# Altium footprint library 镙丝套件.PcbLib: 33 footprints (part 1 of 3)
Each footprint in its own frame and in the unit in brackets; x right, y up, seen from the top. Pads: shape width x height; smd on the part's side, far side on the other; paste and mask are expansions set on the pad; w line width, h text height; cw(c..) or ccw(c..) is an arc to the next point about the centre after c.
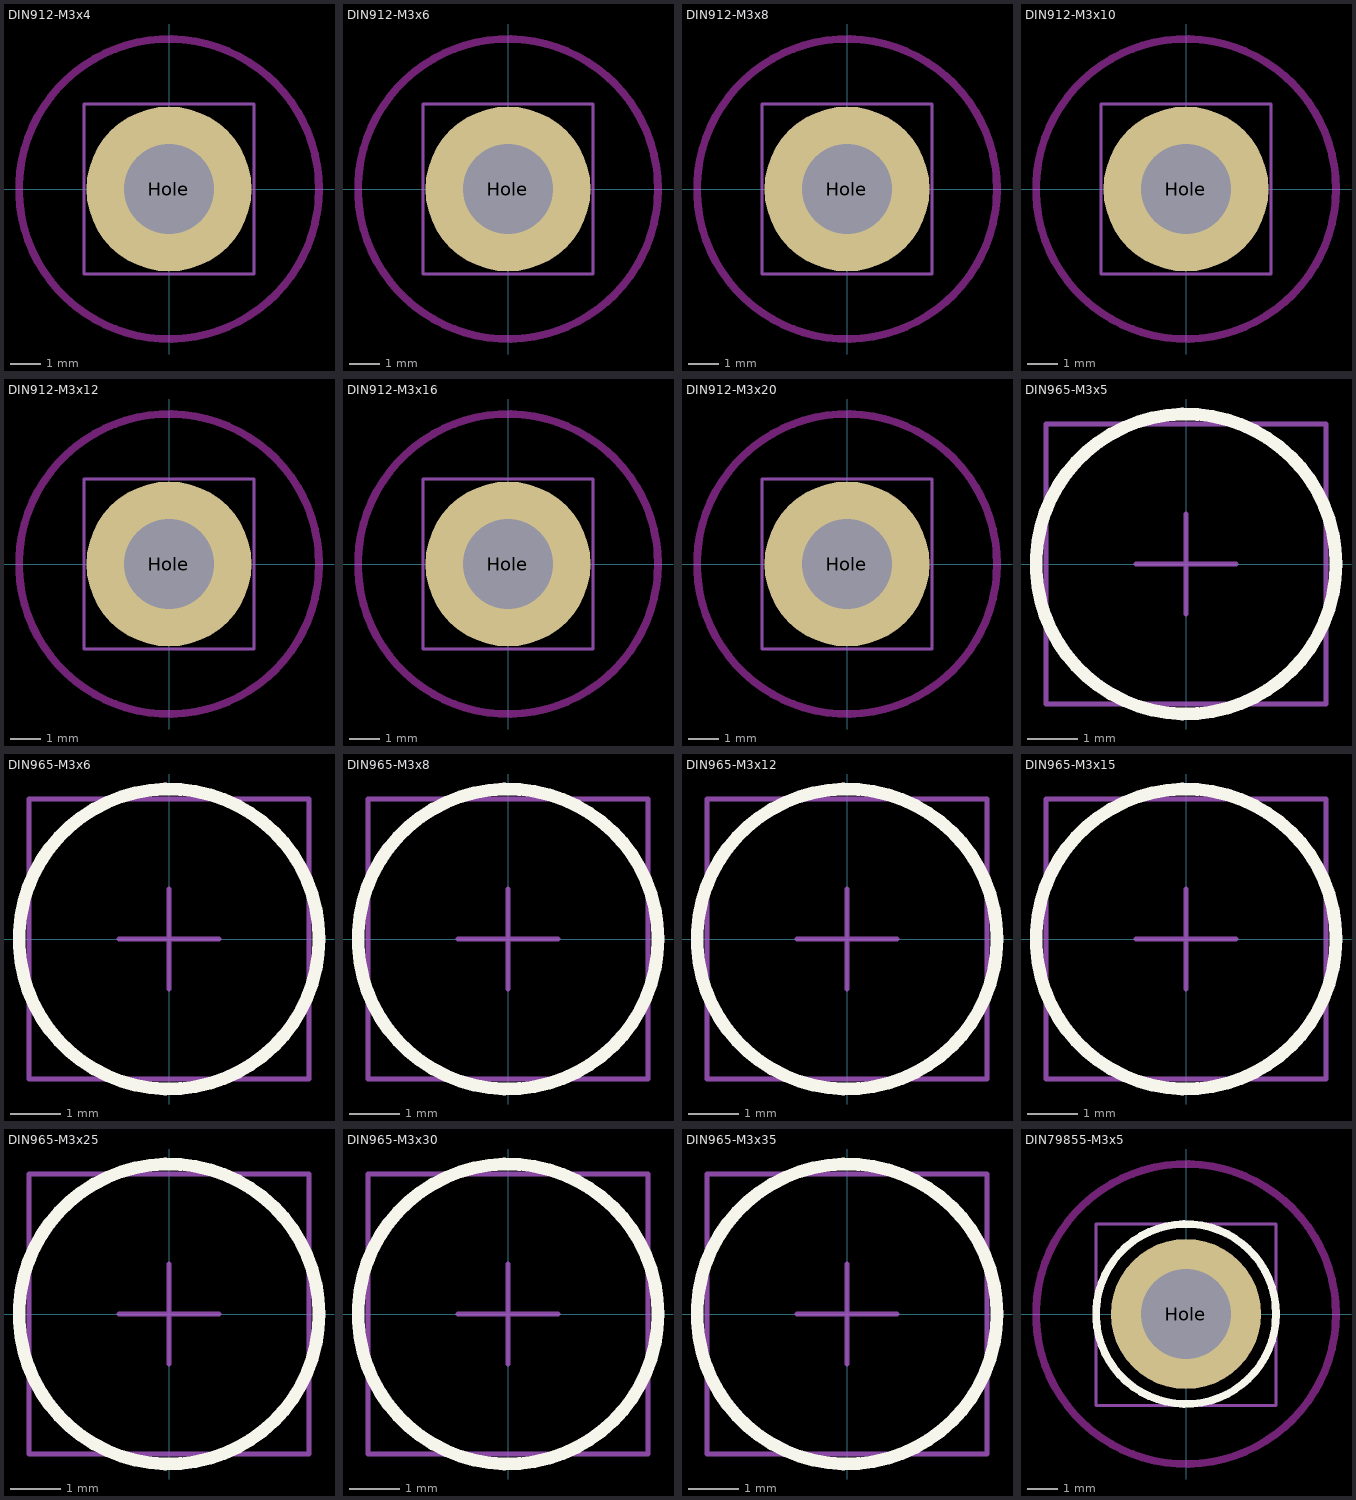
[diagram p0: the footprints below, top view; thin cyan lines are the x and y axes]

## DIN912-M3x4 [mm] "内六角M3X4镙丝"
height 3
pads (1):
  round 5.5 hole 3: Hole(0,0)
Keep-Out Layer:
  circle w0.254: c0,0 r5
Mechanical 1:
  circle w0.15: c0,0 r1.5
Mechanical 13:
  lines w0.1: -2.84,-2.84 2.84,-2.84 2.84,2.84 -2.84,2.84 -2.84,-2.84
Mechanical 15:
  lines w0.1: -1,0 1,0 ; 0,-1 0,1
3D body: height 3.2, standoff -3.69, extent -2.84,-2.84 2.84,2.84

## DIN912-M3x6 [mm] "内六角M3X6镙丝"
height 3
pads (1):
  round 5.5 hole 3: Hole(0,0)
Keep-Out Layer:
  circle w0.254: c0,0 r5
Mechanical 1:
  circle w0.15: c0,0 r1.5
Mechanical 13:
  lines w0.1: -2.84,-2.84 -2.84,2.84 2.84,2.84 2.84,-2.84 -2.84,-2.84
Mechanical 15:
  lines w0.1: -1,0 1,0 ; 0,-1 0,1
3D body: height 3.2, standoff -5.69, extent -2.84,-2.84 2.84,2.84

## DIN912-M3x8 [mm] "内六角M3X8镙丝"
height 3
pads (1):
  round 5.5 hole 3: Hole(0,0)
Keep-Out Layer:
  circle w0.254: c0,0 r5
Mechanical 1:
  circle w0.15: c0,0 r1.5
Mechanical 13:
  lines w0.1: -2.84,-2.84 -2.84,2.84 2.84,2.84 2.84,-2.84 -2.84,-2.84
Mechanical 15:
  lines w0.1: -1,0 1,0 ; 0,-1 0,1
3D body: height 3.2, standoff -7.69, extent -2.84,-2.84 2.84,2.84

## DIN912-M3x10 [mm] "内六角M3X10镙丝"
height 3
pads (1):
  round 5.5 hole 3: Hole(0,0)
Keep-Out Layer:
  circle w0.254: c0,0 r5
Mechanical 1:
  circle w0.15: c0,0 r1.5
Mechanical 13:
  lines w0.1: -2.84,-2.84 2.84,-2.84 2.84,2.84 -2.84,2.84 -2.84,-2.84
Mechanical 15:
  lines w0.1: -1,0 1,0 ; 0,-1 0,1
3D body: height 3.2, standoff -9.69, extent -2.84,-2.84 2.84,2.84

## DIN912-M3x12 [mm] "内六角M3X12镙丝"
height 3
pads (1):
  round 5.5 hole 3: Hole(0,0)
Keep-Out Layer:
  circle w0.254: c0,0 r5
Mechanical 1:
  circle w0.15: c0,0 r1.5
Mechanical 13:
  lines w0.1: -2.84,-2.84 2.84,-2.84 2.84,2.84 -2.84,2.84 -2.84,-2.84
Mechanical 15:
  lines w0.1: -1,0 1,0 ; 0,-1 0,1
3D body: height 3.2, standoff -11.69, extent -2.84,-2.84 2.84,2.84

## DIN912-M3x16 [mm] "内六角M3X16镙丝"
height 3
pads (1):
  round 5.5 hole 3: Hole(0,0)
Keep-Out Layer:
  circle w0.254: c0,0 r5
Mechanical 1:
  circle w0.15: c0,0 r1.5
Mechanical 13:
  lines w0.1: -2.84,-2.84 -2.84,2.84 2.84,2.84 2.84,-2.84 -2.84,-2.84
Mechanical 15:
  lines w0.1: -1,0 1,0 ; 0,-1 0,1
3D body: height 3.2, standoff -15.69, extent -2.84,-2.84 2.84,2.84

## DIN912-M3x20 [mm] "内六角M3X20镙丝"
height 3
pads (1):
  round 5.5 hole 3: Hole(0,0)
Keep-Out Layer:
  circle w0.254: c0,0 r5
Mechanical 1:
  circle w0.15: c0,0 r1.5
Mechanical 13:
  lines w0.1: -2.84,-2.84 -2.84,2.84 2.84,2.84 2.84,-2.84 -2.84,-2.84
Mechanical 15:
  lines w0.1: -1,0 1,0 ; 0,-1 0,1
3D body: height 3.2, standoff -19.69, extent -2.84,-2.84 2.84,2.84

## DIN965-M3x5 [mm] "沉头M3x5mm镙丝"
height 5
Top Overlay:
  circle w0.254: c0,0 r3
Mechanical 13:
  lines w0.1: -2.8,-2.8 -2.8,2.8 2.8,2.8 2.8,-2.8 -2.8,-2.8
Mechanical 15:
  lines w0.1: -1,0 1,0 ; 0,-1 0,1
3D body: height 5, standoff 0, extent -2.8,-2.8 2.8,2.8

## DIN965-M3x6 [mm] "沉头M3x6mm镙丝"
height 6
Top Overlay:
  circle w0.254: c0,0 r3
Mechanical 13:
  lines w0.1: -2.8,-2.8 2.8,-2.8 2.8,2.8 -2.8,2.8 -2.8,-2.8
Mechanical 15:
  lines w0.1: -1,0 1,0 ; 0,-1 0,1
3D body: height 6, standoff 0, extent -2.8,-2.8 2.8,2.8

## DIN965-M3x8 [mm] "沉头M3x8mm镙丝"
height 8
Top Overlay:
  circle w0.254: c0,0 r3
Mechanical 13:
  lines w0.1: -2.8,-2.8 -2.8,2.8 2.8,2.8 2.8,-2.8 -2.8,-2.8
Mechanical 15:
  lines w0.1: -1,0 1,0 ; 0,-1 0,1
3D body: height 8, standoff 0, extent -2.8,-2.8 2.8,2.8

## DIN965-M3x12 [mm] "沉头M3x12mm镙丝"
height 12
Top Overlay:
  circle w0.254: c0,0 r3
Mechanical 13:
  lines w0.1: -2.8,-2.8 2.8,-2.8 2.8,2.8 -2.8,2.8 -2.8,-2.8
Mechanical 15:
  lines w0.1: -1,0 1,0 ; 0,-1 0,1
3D body: height 12, standoff 0, extent -2.8,-2.8 2.8,2.8

## DIN965-M3x15 [mm] "沉头M3x15mm镙丝"
height 15
Top Overlay:
  circle w0.254: c0,0 r3
Mechanical 13:
  lines w0.1: -2.8,-2.8 2.8,-2.8 2.8,2.8 -2.8,2.8 -2.8,-2.8
Mechanical 15:
  lines w0.1: -1,0 1,0 ; 0,-1 0,1
3D body: height 16, standoff 0, extent -2.8,-2.8 2.8,2.8

## DIN965-M3x25 [mm] "沉头M3x25mm镙丝"
height 25
Top Overlay:
  circle w0.254: c0,0 r3
Mechanical 13:
  lines w0.1: -2.8,-2.8 -2.8,2.8 2.8,2.8 2.8,-2.8 -2.8,-2.8
Mechanical 15:
  lines w0.1: -1,0 1,0 ; 0,-1 0,1
3D body: height 26, standoff 0, extent -2.8,-2.8 2.8,2.8

## DIN965-M3x30 [mm] "沉头M3x30mm镙丝"
height 30
Top Overlay:
  circle w0.254: c0,0 r3
Mechanical 13:
  lines w0.1: -2.8,-2.8 2.8,-2.8 2.8,2.8 -2.8,2.8 -2.8,-2.8
Mechanical 15:
  lines w0.1: -1,0 1,0 ; 0,-1 0,1
3D body: height 30, standoff 0, extent -2.8,-2.8 2.8,2.8

## DIN965-M3x35 [mm] "沉头M3x35mm镙丝"
height 35
Top Overlay:
  circle w0.254: c0,0 r3
Mechanical 13:
  lines w0.1: -2.8,-2.8 2.8,-2.8 2.8,2.8 -2.8,2.8 -2.8,-2.8
Mechanical 15:
  lines w0.1: -1,0 1,0 ; 0,-1 0,1
3D body: height 35, standoff 0, extent -2.8,-2.8 2.8,2.8

## DIN79855-M3x5 [mm] "半圆头M3x5mm镙丝"
height 2
pads (1):
  round 5 hole 3: Hole(0,0)
Top Overlay:
  circle w0.254: c0,0 r3
Keep-Out Layer:
  circle w0.254: c0,0 r5
Mechanical 1:
  circle w0.15: c0,0 r1.5
Mechanical 13:
  lines w0.1: -3,-3.048 -3,3 3,3 3,-3.048 -3,-3.048
Mechanical 15:
  lines w0.1: -1,0 1,0 ; 0,-1 0,1
3D body: height 3.47, standoff -4, extent -3,-3 3,3